# Altium schematic symbol library jlcpcb_2025_04_resistors_extended_1210.schlib: 2670 symbols (part 11 of 14) (continued)
## RK73B2ETTD432J
designator R?  Resistance: 4.3kΩ  (hidden comment: *)
Resistor, 4.3kΩ, ±5%, 500mW, ±200ppm/℃, -55℃~+155℃, SMD 1210; Manufacturer: Uniroyal; Manufacturer Part Number: RK73B2ETTD432J; Supplier 1: LCSC; Supplier Part Number 1: C830185; JLCPCB Part Number: C830185; Power Rating: 500mW; Category: Resistors; Package Size: 1210; JLCPCB Basic Part: Yes; Tolerance: ±5%; Temperature Coefficient: ±200ppm/℃; Temperature Rating: -55℃~+155℃; ComponentLink1Description: Datasheet; ComponentLink1URL: https://wmsc.lcsc.com/wmsc/upload/file/pdf/v2/lcsc/2403141437_KOA-Speer-Elec-RK73B2ETTD432J_C830185.pdf; ComponentLink2Description: JLCPCB Part URL; ComponentLink2URL: https://jlcpcb.com/partdetail/C830185
pins: 1, 2
1 alternate drawing of the same symbol

## RK73B2ETTD470J_C131366
designator R?  Resistance: 47Ω  (hidden comment: *)
Resistor, 47Ω, ±5%, 750mW, 200V, ±200ppm/℃, -55℃~+155℃, SMD 1210; Manufacturer: Uniroyal; Manufacturer Part Number: RK73B2ETTD470J; Supplier 1: LCSC; Supplier Part Number 1: C131366; JLCPCB Part Number: C131366; Power Rating: 750mW; Category: Resistors; Package Size: 1210; JLCPCB Basic Part: Yes; Tolerance: ±5%; Voltage Rating: 200V; Temperature Coefficient: ±200ppm/℃; Temperature Rating: -55℃~+155℃; ComponentLink1Description: Datasheet; ComponentLink1URL: https://wmsc.lcsc.com/wmsc/upload/file/pdf/v2/lcsc/2403141437_KOA-Speer-Elec-RK73B2ETTD470J_C131366.pdf; ComponentLink2Description: JLCPCB Part URL; ComponentLink2URL: https://jlcpcb.com/partdetail/C131366
pins: 1, 2
1 alternate drawing of the same symbol

## RK73B2ETTD470J_C520384
designator R?  Resistance: 47Ω  (hidden comment: *)
Resistor, 47Ω, ±5%, 750mW, 200V, ±200ppm/℃, -55℃~+155℃, SMD 1210; Manufacturer: Uniroyal; Manufacturer Part Number: RK73B2ETTD470J; Supplier 1: LCSC; Supplier Part Number 1: C520384; JLCPCB Part Number: C520384; Power Rating: 750mW; Category: Resistors; Package Size: 1210; JLCPCB Basic Part: Yes; Tolerance: ±5%; Voltage Rating: 200V; Temperature Coefficient: ±200ppm/℃; Temperature Rating: -55℃~+155℃; ComponentLink1Description: Datasheet; ComponentLink1URL: https://wmsc.lcsc.com/wmsc/upload/file/pdf/v2/lcsc/2403141437_KOA-Speer-Elec-RK73B2ETTD470J_C520384.pdf; ComponentLink2Description: JLCPCB Part URL; ComponentLink2URL: https://jlcpcb.com/partdetail/C520384
pins: 1, 2
1 alternate drawing of the same symbol

## RK73B2ETTD471J
designator R?  Resistance: 470Ω  (hidden comment: *)
Resistor, 470Ω, ±5%, 500mW, ±200ppm/℃, -55℃~+155℃, SMD 1210; Manufacturer: Uniroyal; Manufacturer Part Number: RK73B2ETTD471J; Supplier 1: LCSC; Supplier Part Number 1: C830186; JLCPCB Part Number: C830186; Power Rating: 500mW; Category: Resistors; Package Size: 1210; JLCPCB Basic Part: Yes; Tolerance: ±5%; Temperature Coefficient: ±200ppm/℃; Temperature Rating: -55℃~+155℃; ComponentLink1Description: Datasheet; ComponentLink1URL: https://wmsc.lcsc.com/wmsc/upload/file/pdf/v2/lcsc/2403141437_KOA-Speer-Elec-RK73B2ETTD471J_C830186.pdf; ComponentLink2Description: JLCPCB Part URL; ComponentLink2URL: https://jlcpcb.com/partdetail/C830186
pins: 1, 2
1 alternate drawing of the same symbol

## RK73B2ETTD472J
designator R?  Resistance: 4.7kΩ  (hidden comment: *)
Resistor, 4.7kΩ, ±5%, 500mW, ±200ppm/℃, -55℃~+155℃, SMD 1210; Manufacturer: Uniroyal; Manufacturer Part Number: RK73B2ETTD472J; Supplier 1: LCSC; Supplier Part Number 1: C830187; JLCPCB Part Number: C830187; Power Rating: 500mW; Category: Resistors; Package Size: 1210; JLCPCB Basic Part: Yes; Tolerance: ±5%; Temperature Coefficient: ±200ppm/℃; Temperature Rating: -55℃~+155℃; ComponentLink1Description: Datasheet; ComponentLink1URL: https://wmsc.lcsc.com/wmsc/upload/file/pdf/v2/lcsc/2403141437_KOA-Speer-Elec-RK73B2ETTD472J_C830187.pdf; ComponentLink2Description: JLCPCB Part URL; ComponentLink2URL: https://jlcpcb.com/partdetail/C830187
pins: 1, 2
1 alternate drawing of the same symbol

## RK73B2ETTD510J
designator R?  Resistance: 51Ω  (hidden comment: *)
Resistor, 51Ω, ±5%, 500mW, ±200ppm/℃, -55℃~+155℃, SMD 1210; Manufacturer: Uniroyal; Manufacturer Part Number: RK73B2ETTD510J; Supplier 1: LCSC; Supplier Part Number 1: C830190; JLCPCB Part Number: C830190; Power Rating: 500mW; Category: Resistors; Package Size: 1210; JLCPCB Basic Part: Yes; Tolerance: ±5%; Temperature Coefficient: ±200ppm/℃; Temperature Rating: -55℃~+155℃; ComponentLink1Description: Datasheet; ComponentLink1URL: https://wmsc.lcsc.com/wmsc/upload/file/pdf/v2/lcsc/2403141437_KOA-Speer-Elec-RK73B2ETTD510J_C830190.pdf; ComponentLink2Description: JLCPCB Part URL; ComponentLink2URL: https://jlcpcb.com/partdetail/C830190
pins: 1, 2
1 alternate drawing of the same symbol

## RK73B2ETTD511J
designator R?  Resistance: 510Ω  (hidden comment: *)
Resistor, 510Ω, ±5%, 500mW, 200V, ±200ppm/℃, -55℃~+155℃, SMD 1210; Manufacturer: Uniroyal; Manufacturer Part Number: RK73B2ETTD511J; Supplier 1: LCSC; Supplier Part Number 1: C516164; JLCPCB Part Number: C516164; Power Rating: 500mW; Category: Resistors; Package Size: 1210; JLCPCB Basic Part: Yes; Tolerance: ±5%; Voltage Rating: 200V; Temperature Coefficient: ±200ppm/℃; Temperature Rating: -55℃~+155℃; ComponentLink1Description: Datasheet; ComponentLink1URL: https://wmsc.lcsc.com/wmsc/upload/file/pdf/v2/lcsc/2403141437_KOA-Speer-Elec-RK73B2ETTD511J_C516164.pdf; ComponentLink2Description: JLCPCB Part URL; ComponentLink2URL: https://jlcpcb.com/partdetail/C516164
pins: 1, 2
1 alternate drawing of the same symbol

## RK73B2ETTD512J
designator R?  Resistance: 5.1kΩ  (hidden comment: *)
Resistor, 5.1kΩ, ±5%, 500mW, ±200ppm/℃, -55℃~+155℃, SMD 1210; Manufacturer: Uniroyal; Manufacturer Part Number: RK73B2ETTD512J; Supplier 1: LCSC; Supplier Part Number 1: C830191; JLCPCB Part Number: C830191; Power Rating: 500mW; Category: Resistors; Package Size: 1210; JLCPCB Basic Part: Yes; Tolerance: ±5%; Temperature Coefficient: ±200ppm/℃; Temperature Rating: -55℃~+155℃; ComponentLink1Description: Datasheet; ComponentLink1URL: https://wmsc.lcsc.com/wmsc/upload/file/pdf/v2/lcsc/2403141437_KOA-Speer-Elec-RK73B2ETTD512J_C830191.pdf; ComponentLink2Description: JLCPCB Part URL; ComponentLink2URL: https://jlcpcb.com/partdetail/C830191
pins: 1, 2
1 alternate drawing of the same symbol

## RK73B2ETTD620J
designator R?  Resistance: 62Ω  (hidden comment: *)
Resistor, 62Ω, ±5%, 500mW, ±200ppm/℃, -55℃~+155℃, SMD 1210; Manufacturer: Uniroyal; Manufacturer Part Number: RK73B2ETTD620J; Supplier 1: LCSC; Supplier Part Number 1: C830193; JLCPCB Part Number: C830193; Power Rating: 500mW; Category: Resistors; Package Size: 1210; JLCPCB Basic Part: Yes; Tolerance: ±5%; Temperature Coefficient: ±200ppm/℃; Temperature Rating: -55℃~+155℃; ComponentLink1Description: Datasheet; ComponentLink1URL: https://wmsc.lcsc.com/wmsc/upload/file/pdf/v2/lcsc/2403141437_KOA-Speer-Elec-RK73B2ETTD620J_C830193.pdf; ComponentLink2Description: JLCPCB Part URL; ComponentLink2URL: https://jlcpcb.com/partdetail/C830193
pins: 1, 2
1 alternate drawing of the same symbol

## RK73B2ETTD681J
designator R?  Resistance: 680Ω  (hidden comment: *)
Resistor, 680Ω, ±5%, 500mW, ±200ppm/℃, -55℃~+155℃, SMD 1210; Manufacturer: Uniroyal; Manufacturer Part Number: RK73B2ETTD681J; Supplier 1: LCSC; Supplier Part Number 1: C830196; JLCPCB Part Number: C830196; Power Rating: 500mW; Category: Resistors; Package Size: 1210; JLCPCB Basic Part: Yes; Tolerance: ±5%; Temperature Coefficient: ±200ppm/℃; Temperature Rating: -55℃~+155℃; ComponentLink1Description: Datasheet; ComponentLink1URL: https://wmsc.lcsc.com/wmsc/upload/file/pdf/v2/lcsc/2403141437_KOA-Speer-Elec-RK73B2ETTD681J_C830196.pdf; ComponentLink2Description: JLCPCB Part URL; ComponentLink2URL: https://jlcpcb.com/partdetail/C830196
pins: 1, 2
1 alternate drawing of the same symbol

## RK73B2ETTD753J
designator R?  Resistance: 75kΩ  (hidden comment: *)
Resistor, 75kΩ, ±5%, 500mW, ±200ppm/℃, -55℃~+155℃, SMD 1210; Manufacturer: Uniroyal; Manufacturer Part Number: RK73B2ETTD753J; Supplier 1: LCSC; Supplier Part Number 1: C830199; JLCPCB Part Number: C830199; Power Rating: 500mW; Category: Resistors; Package Size: 1210; JLCPCB Basic Part: Yes; Tolerance: ±5%; Temperature Coefficient: ±200ppm/℃; Temperature Rating: -55℃~+155℃; ComponentLink1Description: Datasheet; ComponentLink1URL: https://wmsc.lcsc.com/wmsc/upload/file/pdf/v2/lcsc/2403141437_KOA-Speer-Elec-RK73B2ETTD753J_C830199.pdf; ComponentLink2Description: JLCPCB Part URL; ComponentLink2URL: https://jlcpcb.com/partdetail/C830199
pins: 1, 2
1 alternate drawing of the same symbol

## RK73B2ETTD822J
designator R?  Resistance: 8.2kΩ  (hidden comment: *)
Resistor, 8.2kΩ, ±5%, 500mW, ±200ppm/℃, -55℃~+155℃, SMD 1210; Manufacturer: Uniroyal; Manufacturer Part Number: RK73B2ETTD822J; Supplier 1: LCSC; Supplier Part Number 1: C830200; JLCPCB Part Number: C830200; Power Rating: 500mW; Category: Resistors; Package Size: 1210; JLCPCB Basic Part: Yes; Tolerance: ±5%; Temperature Coefficient: ±200ppm/℃; Temperature Rating: -55℃~+155℃; ComponentLink1Description: Datasheet; ComponentLink1URL: https://wmsc.lcsc.com/wmsc/upload/file/pdf/v2/lcsc/2403141437_KOA-Speer-Elec-RK73B2ETTD822J_C830200.pdf; ComponentLink2Description: JLCPCB Part URL; ComponentLink2URL: https://jlcpcb.com/partdetail/C830200
pins: 1, 2
1 alternate drawing of the same symbol

## RK73B2ETTD911J
designator R?  Resistance: 910Ω  (hidden comment: *)
Resistor, 910Ω, ±5%, 500mW, ±200ppm/℃, -55℃~+155℃, SMD 1210; Manufacturer: Uniroyal; Manufacturer Part Number: RK73B2ETTD911J; Supplier 1: LCSC; Supplier Part Number 1: C830201; JLCPCB Part Number: C830201; Power Rating: 500mW; Category: Resistors; Package Size: 1210; JLCPCB Basic Part: Yes; Tolerance: ±5%; Temperature Coefficient: ±200ppm/℃; Temperature Rating: -55℃~+155℃; ComponentLink1Description: Datasheet; ComponentLink1URL: https://wmsc.lcsc.com/wmsc/upload/file/pdf/v2/lcsc/2403141437_KOA-Speer-Elec-RK73B2ETTD911J_C830201.pdf; ComponentLink2Description: JLCPCB Part URL; ComponentLink2URL: https://jlcpcb.com/partdetail/C830201
pins: 1, 2
1 alternate drawing of the same symbol

## RK73H2ETTD1R20F
designator R?  Resistance: 1.2Ω  (hidden comment: *)
Resistor, 1.2Ω, ±1%, 500mW, ±200ppm/℃, -55℃~+155℃, SMD 1210; Manufacturer: Uniroyal; Manufacturer Part Number: RK73H2ETTD1R20F; Supplier 1: LCSC; Supplier Part Number 1: C830419; JLCPCB Part Number: C830419; Power Rating: 500mW; Category: Resistors; Package Size: 1210; JLCPCB Basic Part: Yes; Tolerance: ±1%; Temperature Coefficient: ±200ppm/℃; Temperature Rating: -55℃~+155℃; ComponentLink1Description: Datasheet; ComponentLink1URL: https://wmsc.lcsc.com/wmsc/upload/file/pdf/v2/lcsc/2304140030_KOA-Speer-Elec-RK73H2ETTD1R20F_C830419.pdf; ComponentLink2Description: JLCPCB Part URL; ComponentLink2URL: https://jlcpcb.com/partdetail/C830419
pins: 1, 2
1 alternate drawing of the same symbol

## RK73H2ETTD1R50F
designator R?  Resistance: 1.5Ω  (hidden comment: *)
Resistor, 1.5Ω, ±1%, 500mW, 200V, ±200ppm/℃, -55℃~+155℃, SMD 1210; Manufacturer: Uniroyal; Manufacturer Part Number: RK73H2ETTD1R50F; Supplier 1: LCSC; Supplier Part Number 1: C516152; JLCPCB Part Number: C516152; Power Rating: 500mW; Category: Resistors; Package Size: 1210; JLCPCB Basic Part: Yes; Tolerance: ±1%; Voltage Rating: 200V; Temperature Coefficient: ±200ppm/℃; Temperature Rating: -55℃~+155℃; ComponentLink1Description: Datasheet; ComponentLink1URL: https://wmsc.lcsc.com/wmsc/upload/file/pdf/v2/lcsc/2304140030_KOA-Speer-Elec-RK73H2ETTD1R50F_C516152.pdf; ComponentLink2Description: JLCPCB Part URL; ComponentLink2URL: https://jlcpcb.com/partdetail/C516152
pins: 1, 2
1 alternate drawing of the same symbol

## RK73H2ETTD15R0F
designator R?  Resistance: 15Ω  (hidden comment: *)
Resistor, 15Ω, ±1%, 500mW, ±100ppm/℃, -55℃~+155℃, SMD 1210; Manufacturer: Uniroyal; Manufacturer Part Number: RK73H2ETTD15R0F; Supplier 1: LCSC; Supplier Part Number 1: C830418; JLCPCB Part Number: C830418; Power Rating: 500mW; Category: Resistors; Package Size: 1210; JLCPCB Basic Part: Yes; Tolerance: ±1%; Temperature Coefficient: ±100ppm/℃; Temperature Rating: -55℃~+155℃; ComponentLink1Description: Datasheet; ComponentLink1URL: https://wmsc.lcsc.com/wmsc/upload/file/pdf/v2/lcsc/2304140030_KOA-Speer-Elec-RK73H2ETTD15R0F_C830418.pdf; ComponentLink2Description: JLCPCB Part URL; ComponentLink2URL: https://jlcpcb.com/partdetail/C830418
pins: 1, 2
1 alternate drawing of the same symbol

## RK73H2ETTD27R0F
designator R?  Resistance: 27Ω  (hidden comment: *)
Resistor, 27Ω, ±1%, 500mW, 200V, ±100ppm/℃, -55℃~+155℃, SMD 1210; Manufacturer: Uniroyal; Manufacturer Part Number: RK73H2ETTD27R0F; Supplier 1: LCSC; Supplier Part Number 1: C346144; JLCPCB Part Number: C346144; Power Rating: 500mW; Category: Resistors; Package Size: 1210; JLCPCB Basic Part: Yes; Tolerance: ±1%; Voltage Rating: 200V; Temperature Coefficient: ±100ppm/℃; Temperature Rating: -55℃~+155℃; ComponentLink1Description: Datasheet; ComponentLink1URL: https://wmsc.lcsc.com/wmsc/upload/file/pdf/v2/lcsc/1912111437_KOA-Speer-Elec-RK73H2ETTD27R0F_C346144.pdf; ComponentLink2Description: JLCPCB Part URL; ComponentLink2URL: https://jlcpcb.com/partdetail/C346144
pins: 1, 2
1 alternate drawing of the same symbol

## RK73H2ETTD30R0F
designator R?  Resistance: 30Ω  (hidden comment: *)
Resistor, 30Ω, ±1%, 500mW, ±100ppm/℃, -55℃~+155℃, SMD 1210; Manufacturer: Uniroyal; Manufacturer Part Number: RK73H2ETTD30R0F; Supplier 1: LCSC; Supplier Part Number 1: C830423; JLCPCB Part Number: C830423; Power Rating: 500mW; Category: Resistors; Package Size: 1210; JLCPCB Basic Part: Yes; Tolerance: ±1%; Temperature Coefficient: ±100ppm/℃; Temperature Rating: -55℃~+155℃; ComponentLink1Description: Datasheet; ComponentLink1URL: https://wmsc.lcsc.com/wmsc/upload/file/pdf/v2/lcsc/2304140030_KOA-Speer-Elec-RK73H2ETTD30R0F_C830423.pdf; ComponentLink2Description: JLCPCB Part URL; ComponentLink2URL: https://jlcpcb.com/partdetail/C830423
pins: 1, 2
1 alternate drawing of the same symbol

## RK73H2ETTD51R1F
designator R?  Resistance: 51.1Ω  (hidden comment: *)
Resistor, 51.1Ω, ±1%, 500mW, 200V, ±100ppm/℃, -55℃~+155℃, SMD 1210; Manufacturer: Uniroyal; Manufacturer Part Number: RK73H2ETTD51R1F; Supplier 1: LCSC; Supplier Part Number 1: C284139; JLCPCB Part Number: C284139; Power Rating: 500mW; Category: Resistors; Package Size: 1210; JLCPCB Basic Part: Yes; Tolerance: ±1%; Voltage Rating: 200V; Temperature Coefficient: ±100ppm/℃; Temperature Rating: -55℃~+155℃; ComponentLink1Description: Datasheet; ComponentLink1URL: https://wmsc.lcsc.com/wmsc/upload/file/pdf/v2/lcsc/1810170743_KOA-Speer-Elec-RK73H2ETTD51R1F_C284139.pdf; ComponentLink2Description: JLCPCB Part URL; ComponentLink2URL: https://jlcpcb.com/partdetail/C284139
pins: 1, 2
1 alternate drawing of the same symbol

## RK73H2ETTD60R4F
designator R?  Resistance: 60.4Ω  (hidden comment: *)
Resistor, 60.4Ω, ±1%, 500mW, ±100ppm/℃, -55℃~+155℃, SMD 1210; Manufacturer: Uniroyal; Manufacturer Part Number: RK73H2ETTD60R4F; Supplier 1: LCSC; Supplier Part Number 1: C830424; JLCPCB Part Number: C830424; Power Rating: 500mW; Category: Resistors; Package Size: 1210; JLCPCB Basic Part: Yes; Tolerance: ±1%; Temperature Coefficient: ±100ppm/℃; Temperature Rating: -55℃~+155℃; ComponentLink1Description: Datasheet; ComponentLink1URL: https://wmsc.lcsc.com/wmsc/upload/file/pdf/v2/lcsc/2304140030_KOA-Speer-Elec-RK73H2ETTD60R4F_C830424.pdf; ComponentLink2Description: JLCPCB Part URL; ComponentLink2URL: https://jlcpcb.com/partdetail/C830424
pins: 1, 2
1 alternate drawing of the same symbol

## RK73H2ETTD61R9F
designator R?  Resistance: 61.9Ω  (hidden comment: *)
Resistor, 61.9Ω, ±1%, 500mW, ±100ppm/℃, -55℃~+155℃, SMD 1210; Manufacturer: Uniroyal; Manufacturer Part Number: RK73H2ETTD61R9F; Supplier 1: LCSC; Supplier Part Number 1: C830425; JLCPCB Part Number: C830425; Power Rating: 500mW; Category: Resistors; Package Size: 1210; JLCPCB Basic Part: Yes; Tolerance: ±1%; Temperature Coefficient: ±100ppm/℃; Temperature Rating: -55℃~+155℃; ComponentLink1Description: Datasheet; ComponentLink1URL: https://wmsc.lcsc.com/wmsc/upload/file/pdf/v2/lcsc/2304140030_KOA-Speer-Elec-RK73H2ETTD61R9F_C830425.pdf; ComponentLink2Description: JLCPCB Part URL; ComponentLink2URL: https://jlcpcb.com/partdetail/C830425
pins: 1, 2
1 alternate drawing of the same symbol

## RK73H2ETTD1001F
designator R?  Resistance: 1kΩ  (hidden comment: *)
Resistor, 1kΩ, ±1%, 500mW, 200V, ±100ppm/℃, -55℃~+155℃, SMD 1210; Manufacturer: Uniroyal; Manufacturer Part Number: RK73H2ETTD1001F; Supplier 1: LCSC; Supplier Part Number 1: C516147; JLCPCB Part Number: C516147; Power Rating: 500mW; Category: Resistors; Package Size: 1210; JLCPCB Basic Part: Yes; Tolerance: ±1%; Voltage Rating: 200V; Temperature Coefficient: ±100ppm/℃; Temperature Rating: -55℃~+155℃; ComponentLink1Description: Datasheet; ComponentLink1URL: https://wmsc.lcsc.com/wmsc/upload/file/pdf/v2/lcsc/2304140030_KOA-Speer-Elec-RK73H2ETTD1001F_C516147.pdf; ComponentLink2Description: JLCPCB Part URL; ComponentLink2URL: https://jlcpcb.com/partdetail/C516147
pins: 1, 2
1 alternate drawing of the same symbol

## RK73H2ETTD1002F
designator R?  Resistance: 10kΩ  (hidden comment: *)
Resistor, 10kΩ, ±1%, 500mW, 200V, ±100ppm/℃, -55℃~+155℃, SMD 1210; Manufacturer: Uniroyal; Manufacturer Part Number: RK73H2ETTD1002F; Supplier 1: LCSC; Supplier Part Number 1: C516148; JLCPCB Part Number: C516148; Power Rating: 500mW; Category: Resistors; Package Size: 1210; JLCPCB Basic Part: Yes; Tolerance: ±1%; Voltage Rating: 200V; Temperature Coefficient: ±100ppm/℃; Temperature Rating: -55℃~+155℃; ComponentLink1Description: Datasheet; ComponentLink1URL: https://wmsc.lcsc.com/wmsc/upload/file/pdf/v2/lcsc/2304140030_KOA-Speer-Elec-RK73H2ETTD1002F_C516148.pdf; ComponentLink2Description: JLCPCB Part URL; ComponentLink2URL: https://jlcpcb.com/partdetail/C516148
pins: 1, 2
1 alternate drawing of the same symbol

## RK73H2ETTD1200F
designator R?  Resistance: 120Ω  (hidden comment: *)
Resistor, 120Ω, ±1%, 500mW, 200V, ±100ppm/℃, -55℃~+155℃, SMD 1210; Manufacturer: Uniroyal; Manufacturer Part Number: RK73H2ETTD1200F; Supplier 1: LCSC; Supplier Part Number 1: C346143; JLCPCB Part Number: C346143; Power Rating: 500mW; Category: Resistors; Package Size: 1210; JLCPCB Basic Part: Yes; Tolerance: ±1%; Voltage Rating: 200V; Temperature Coefficient: ±100ppm/℃; Temperature Rating: -55℃~+155℃; ComponentLink1Description: Datasheet; ComponentLink1URL: https://wmsc.lcsc.com/wmsc/upload/file/pdf/v2/lcsc/2304140030_KOA-Speer-Elec-RK73H2ETTD1200F_C346143.pdf; ComponentLink2Description: JLCPCB Part URL; ComponentLink2URL: https://jlcpcb.com/partdetail/C346143
pins: 1, 2
1 alternate drawing of the same symbol

## RK73H2ETTD1301F
designator R?  Resistance: 1.3kΩ  (hidden comment: *)
Resistor, 1.3kΩ, ±1%, 500mW, ±100ppm/℃, -55℃~+155℃, SMD 1210; Manufacturer: Uniroyal; Manufacturer Part Number: RK73H2ETTD1301F; Supplier 1: LCSC; Supplier Part Number 1: C830414; JLCPCB Part Number: C830414; Power Rating: 500mW; Category: Resistors; Package Size: 1210; JLCPCB Basic Part: Yes; Tolerance: ±1%; Temperature Coefficient: ±100ppm/℃; Temperature Rating: -55℃~+155℃; ComponentLink1Description: Datasheet; ComponentLink1URL: https://wmsc.lcsc.com/wmsc/upload/file/pdf/v2/lcsc/2304140030_KOA-Speer-Elec-RK73H2ETTD1301F_C830414.pdf; ComponentLink2Description: JLCPCB Part URL; ComponentLink2URL: https://jlcpcb.com/partdetail/C830414
pins: 1, 2
1 alternate drawing of the same symbol

## RK73H2ETTD1370F
designator R?  Resistance: 137Ω  (hidden comment: *)
Resistor, 137Ω, ±1%, 500mW, ±100ppm/℃, -55℃~+155℃, SMD 1210; Manufacturer: Uniroyal; Manufacturer Part Number: RK73H2ETTD1370F; Supplier 1: LCSC; Supplier Part Number 1: C830415; JLCPCB Part Number: C830415; Power Rating: 500mW; Category: Resistors; Package Size: 1210; JLCPCB Basic Part: Yes; Tolerance: ±1%; Temperature Coefficient: ±100ppm/℃; Temperature Rating: -55℃~+155℃; ComponentLink1Description: Datasheet; ComponentLink1URL: https://wmsc.lcsc.com/wmsc/upload/file/pdf/v2/lcsc/2304140030_KOA-Speer-Elec-RK73H2ETTD1370F_C830415.pdf; ComponentLink2Description: JLCPCB Part URL; ComponentLink2URL: https://jlcpcb.com/partdetail/C830415
pins: 1, 2
1 alternate drawing of the same symbol

## RK73H2ETTD1500F
designator R?  Resistance: 150Ω  (hidden comment: *)
Resistor, 150Ω, ±1%, 500mW, ±100ppm/℃, -55℃~+155℃, SMD 1210; Manufacturer: Uniroyal; Manufacturer Part Number: RK73H2ETTD1500F; Supplier 1: LCSC; Supplier Part Number 1: C830416; JLCPCB Part Number: C830416; Power Rating: 500mW; Category: Resistors; Package Size: 1210; JLCPCB Basic Part: Yes; Tolerance: ±1%; Temperature Coefficient: ±100ppm/℃; Temperature Rating: -55℃~+155℃; ComponentLink1Description: Datasheet; ComponentLink1URL: https://wmsc.lcsc.com/wmsc/upload/file/pdf/v2/lcsc/2304140030_KOA-Speer-Elec-RK73H2ETTD1500F_C830416.pdf; ComponentLink2Description: JLCPCB Part URL; ComponentLink2URL: https://jlcpcb.com/partdetail/C830416
pins: 1, 2
1 alternate drawing of the same symbol

## RK73H2ETTD1501F
designator R?  Resistance: 1.5kΩ  (hidden comment: *)
Resistor, 1.5kΩ, ±1%, 500mW, ±100ppm/℃, -55℃~+155℃, SMD 1210; Manufacturer: Uniroyal; Manufacturer Part Number: RK73H2ETTD1501F; Supplier 1: LCSC; Supplier Part Number 1: C830417; JLCPCB Part Number: C830417; Power Rating: 500mW; Category: Resistors; Package Size: 1210; JLCPCB Basic Part: Yes; Tolerance: ±1%; Temperature Coefficient: ±100ppm/℃; Temperature Rating: -55℃~+155℃; ComponentLink1Description: Datasheet; ComponentLink1URL: https://wmsc.lcsc.com/wmsc/upload/file/pdf/v2/lcsc/2304140030_KOA-Speer-Elec-RK73H2ETTD1501F_C830417.pdf; ComponentLink2Description: JLCPCB Part URL; ComponentLink2URL: https://jlcpcb.com/partdetail/C830417
pins: 1, 2
1 alternate drawing of the same symbol

## RK73H2ETTD1801F
designator R?  Resistance: 1.8kΩ  (hidden comment: *)
Resistor, 1.8kΩ, ±1%, 500mW, ±100ppm/℃, -55℃~+155℃, SMD 1210; Manufacturer: Uniroyal; Manufacturer Part Number: RK73H2ETTD1801F; Supplier 1: LCSC; Supplier Part Number 1: C719291; JLCPCB Part Number: C719291; Power Rating: 500mW; Category: Resistors; Package Size: 1210; JLCPCB Basic Part: Yes; Tolerance: ±1%; Temperature Coefficient: ±100ppm/℃; Temperature Rating: -55℃~+155℃; ComponentLink1Description: Datasheet; ComponentLink1URL: https://wmsc.lcsc.com/wmsc/upload/file/pdf/v2/lcsc/2304140030_KOA-Speer-Elec-RK73H2ETTD1801F_C719291.pdf; ComponentLink2Description: JLCPCB Part URL; ComponentLink2URL: https://jlcpcb.com/partdetail/C719291
pins: 1, 2
1 alternate drawing of the same symbol

## RK73H2ETTD2000F
designator R?  Resistance: 200Ω  (hidden comment: *)
Resistor, 200Ω, ±1%, 500mW, ±100ppm/℃, -55℃~+155℃, SMD 1210; Manufacturer: Uniroyal; Manufacturer Part Number: RK73H2ETTD2000F; Supplier 1: LCSC; Supplier Part Number 1: C830420; JLCPCB Part Number: C830420; Power Rating: 500mW; Category: Resistors; Package Size: 1210; JLCPCB Basic Part: Yes; Tolerance: ±1%; Temperature Coefficient: ±100ppm/℃; Temperature Rating: -55℃~+155℃; ComponentLink1Description: Datasheet; ComponentLink1URL: https://wmsc.lcsc.com/wmsc/upload/file/pdf/v2/lcsc/2304140030_KOA-Speer-Elec-RK73H2ETTD2000F_C830420.pdf; ComponentLink2Description: JLCPCB Part URL; ComponentLink2URL: https://jlcpcb.com/partdetail/C830420
pins: 1, 2
1 alternate drawing of the same symbol

## RK73H2ETTD2200F
designator R?  Resistance: 220Ω  (hidden comment: *)
Resistor, 220Ω, ±1%, 500mW, 200V, ±100ppm/℃, -55℃~+155℃, SMD 1210; Manufacturer: Uniroyal; Manufacturer Part Number: RK73H2ETTD2200F; Supplier 1: LCSC; Supplier Part Number 1: C516154; JLCPCB Part Number: C516154; Power Rating: 500mW; Category: Resistors; Package Size: 1210; JLCPCB Basic Part: Yes; Tolerance: ±1%; Voltage Rating: 200V; Temperature Coefficient: ±100ppm/℃; Temperature Rating: -55℃~+155℃; ComponentLink1Description: Datasheet; ComponentLink1URL: https://wmsc.lcsc.com/wmsc/upload/file/pdf/v2/lcsc/2304140030_KOA-Speer-Elec-RK73H2ETTD2200F_C516154.pdf; ComponentLink2Description: JLCPCB Part URL; ComponentLink2URL: https://jlcpcb.com/partdetail/C516154
pins: 1, 2
1 alternate drawing of the same symbol

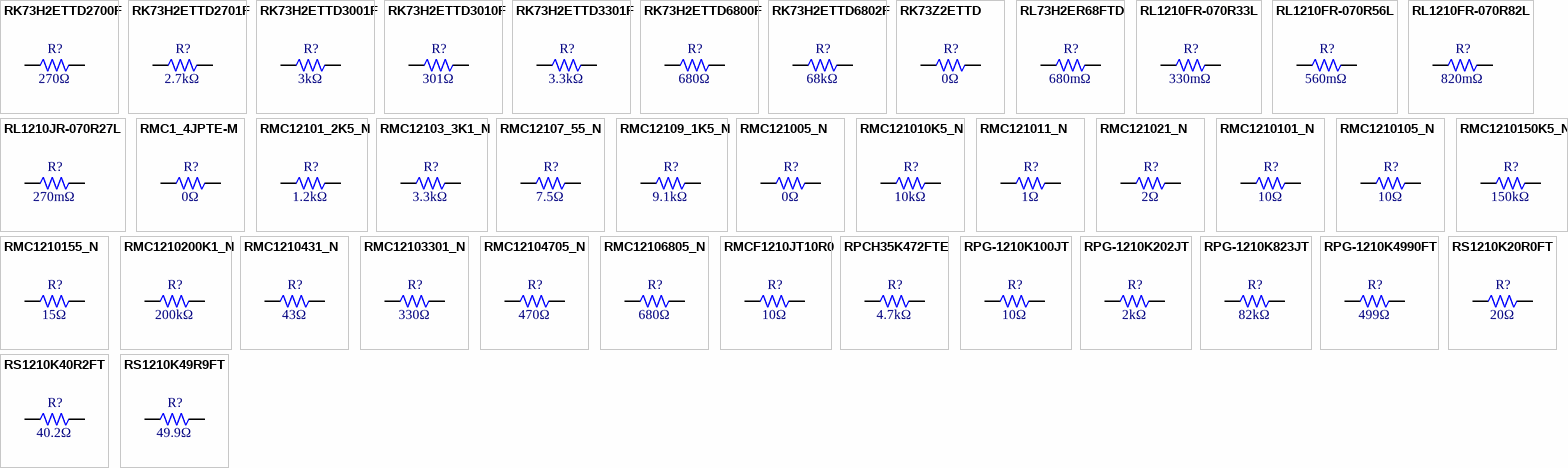
[diagram p53: symbols RK73H2ETTD2700F to RS1210K49R9FT]

## RK73H2ETTD2700F
designator R?  Resistance: 270Ω  (hidden comment: *)
Resistor, 270Ω, ±1%, 500mW, ±100ppm/℃, -55℃~+155℃, SMD 1210; Manufacturer: Uniroyal; Manufacturer Part Number: RK73H2ETTD2700F; Supplier 1: LCSC; Supplier Part Number 1: C830421; JLCPCB Part Number: C830421; Power Rating: 500mW; Category: Resistors; Package Size: 1210; JLCPCB Basic Part: Yes; Tolerance: ±1%; Temperature Coefficient: ±100ppm/℃; Temperature Rating: -55℃~+155℃; ComponentLink1Description: Datasheet; ComponentLink1URL: https://wmsc.lcsc.com/wmsc/upload/file/pdf/v2/lcsc/2304140030_KOA-Speer-Elec-RK73H2ETTD2700F_C830421.pdf; ComponentLink2Description: JLCPCB Part URL; ComponentLink2URL: https://jlcpcb.com/partdetail/C830421
pins: 1, 2
1 alternate drawing of the same symbol

## RK73H2ETTD2701F
designator R?  Resistance: 2.7kΩ  (hidden comment: *)
Resistor, 2.7kΩ, ±1%, 500mW, 200V, ±100ppm/℃, -55℃~+155℃, SMD 1210; Manufacturer: Uniroyal; Manufacturer Part Number: RK73H2ETTD2701F; Supplier 1: LCSC; Supplier Part Number 1: C516155; JLCPCB Part Number: C516155; Power Rating: 500mW; Category: Resistors; Package Size: 1210; JLCPCB Basic Part: Yes; Tolerance: ±1%; Voltage Rating: 200V; Temperature Coefficient: ±100ppm/℃; Temperature Rating: -55℃~+155℃; ComponentLink1Description: Datasheet; ComponentLink1URL: https://wmsc.lcsc.com/wmsc/upload/file/pdf/v2/lcsc/2304140030_KOA-Speer-Elec-RK73H2ETTD2701F_C516155.pdf; ComponentLink2Description: JLCPCB Part URL; ComponentLink2URL: https://jlcpcb.com/partdetail/C516155
pins: 1, 2
1 alternate drawing of the same symbol

## RK73H2ETTD3001F
designator R?  Resistance: 3kΩ  (hidden comment: *)
Resistor, 3kΩ, ±1%, 500mW, 200V, ±100ppm/℃, -55℃~+155℃, SMD 1210; Manufacturer: Uniroyal; Manufacturer Part Number: RK73H2ETTD3001F; Supplier 1: LCSC; Supplier Part Number 1: C516156; JLCPCB Part Number: C516156; Power Rating: 500mW; Category: Resistors; Package Size: 1210; JLCPCB Basic Part: Yes; Tolerance: ±1%; Voltage Rating: 200V; Temperature Coefficient: ±100ppm/℃; Temperature Rating: -55℃~+155℃; ComponentLink1Description: Datasheet; ComponentLink1URL: https://wmsc.lcsc.com/wmsc/upload/file/pdf/v2/lcsc/2304140030_KOA-Speer-Elec-RK73H2ETTD3001F_C516156.pdf; ComponentLink2Description: JLCPCB Part URL; ComponentLink2URL: https://jlcpcb.com/partdetail/C516156
pins: 1, 2
1 alternate drawing of the same symbol

## RK73H2ETTD3010F
designator R?  Resistance: 301Ω  (hidden comment: *)
Resistor, 301Ω, ±1%, 500mW, ±100ppm/℃, -55℃~+155℃, SMD 1210; Manufacturer: Uniroyal; Manufacturer Part Number: RK73H2ETTD3010F; Supplier 1: LCSC; Supplier Part Number 1: C830422; JLCPCB Part Number: C830422; Power Rating: 500mW; Category: Resistors; Package Size: 1210; JLCPCB Basic Part: Yes; Tolerance: ±1%; Temperature Coefficient: ±100ppm/℃; Temperature Rating: -55℃~+155℃; ComponentLink1Description: Datasheet; ComponentLink1URL: https://wmsc.lcsc.com/wmsc/upload/file/pdf/v2/lcsc/2304140030_KOA-Speer-Elec-RK73H2ETTD3010F_C830422.pdf; ComponentLink2Description: JLCPCB Part URL; ComponentLink2URL: https://jlcpcb.com/partdetail/C830422
pins: 1, 2
1 alternate drawing of the same symbol

## RK73H2ETTD3301F
designator R?  Resistance: 3.3kΩ  (hidden comment: *)
Resistor, 3.3kΩ, ±1%, 500mW, 200V, ±100ppm/℃, -55℃~+155℃, SMD 1210; Manufacturer: Uniroyal; Manufacturer Part Number: RK73H2ETTD3301F; Supplier 1: LCSC; Supplier Part Number 1: C516157; JLCPCB Part Number: C516157; Power Rating: 500mW; Category: Resistors; Package Size: 1210; JLCPCB Basic Part: Yes; Tolerance: ±1%; Voltage Rating: 200V; Temperature Coefficient: ±100ppm/℃; Temperature Rating: -55℃~+155℃; ComponentLink1Description: Datasheet; ComponentLink1URL: https://wmsc.lcsc.com/wmsc/upload/file/pdf/v2/lcsc/2304140030_KOA-Speer-Elec-RK73H2ETTD3301F_C516157.pdf; ComponentLink2Description: JLCPCB Part URL; ComponentLink2URL: https://jlcpcb.com/partdetail/C516157
pins: 1, 2
1 alternate drawing of the same symbol

## RK73H2ETTD6800F
designator R?  Resistance: 680Ω  (hidden comment: *)
Resistor, 680Ω, ±1%, 500mW, 200V, ±100ppm/℃, -55℃~+155℃, SMD 1210; Manufacturer: Uniroyal; Manufacturer Part Number: RK73H2ETTD6800F; Supplier 1: LCSC; Supplier Part Number 1: C516159; JLCPCB Part Number: C516159; Power Rating: 500mW; Category: Resistors; Package Size: 1210; JLCPCB Basic Part: Yes; Tolerance: ±1%; Voltage Rating: 200V; Temperature Coefficient: ±100ppm/℃; Temperature Rating: -55℃~+155℃; ComponentLink1Description: Datasheet; ComponentLink1URL: https://wmsc.lcsc.com/wmsc/upload/file/pdf/v2/lcsc/2304140030_KOA-Speer-Elec-RK73H2ETTD6800F_C516159.pdf; ComponentLink2Description: JLCPCB Part URL; ComponentLink2URL: https://jlcpcb.com/partdetail/C516159
pins: 1, 2
1 alternate drawing of the same symbol

## RK73H2ETTD6802F
designator R?  Resistance: 68kΩ  (hidden comment: *)
Resistor, 68kΩ, ±1%, 500mW, 200V, ±100ppm/℃, -55℃~+155℃, SMD 1210; Manufacturer: Uniroyal; Manufacturer Part Number: RK73H2ETTD6802F; Supplier 1: LCSC; Supplier Part Number 1: C516160; JLCPCB Part Number: C516160; Power Rating: 500mW; Category: Resistors; Package Size: 1210; JLCPCB Basic Part: Yes; Tolerance: ±1%; Voltage Rating: 200V; Temperature Coefficient: ±100ppm/℃; Temperature Rating: -55℃~+155℃; ComponentLink1Description: Datasheet; ComponentLink1URL: https://wmsc.lcsc.com/wmsc/upload/file/pdf/v2/lcsc/2304140030_KOA-Speer-Elec-RK73H2ETTD6802F_C516160.pdf; ComponentLink2Description: JLCPCB Part URL; ComponentLink2URL: https://jlcpcb.com/partdetail/C516160
pins: 1, 2
1 alternate drawing of the same symbol

## RK73Z2ETTD
designator R?  Resistance: 0Ω  (hidden comment: *)
Resistor, 0Ω, -55℃~+155℃, SMD 1210; Manufacturer: Uniroyal; Manufacturer Part Number: RK73Z2ETTD; Supplier 1: LCSC; Supplier Part Number 1: C211708; JLCPCB Part Number: C211708; Category: Resistors; Package Size: 1210; JLCPCB Basic Part: Yes; Temperature Rating: -55℃~+155℃; ComponentLink1Description: Datasheet; ComponentLink1URL: https://wmsc.lcsc.com/wmsc/upload/file/pdf/v2/lcsc/1810170642_KOA-Speer-Elec-RK73Z2ETTD_C211708.pdf; ComponentLink2Description: JLCPCB Part URL; ComponentLink2URL: https://jlcpcb.com/partdetail/C211708
pins: 1, 2
1 alternate drawing of the same symbol

## RL73H2ER68FTD
designator R?  Resistance: 680mΩ  (hidden comment: *)
Resistor, 680mΩ, ±1%, 500mW, ±100ppm/℃, -55℃~+155℃, SMD 1210; Manufacturer: Uniroyal; Manufacturer Part Number: RL73H2ER68FTD; Supplier 1: LCSC; Supplier Part Number 1: C4050380; JLCPCB Part Number: C4050380; Power Rating: 500mW; Category: Resistors; Package Size: 1210; JLCPCB Basic Part: Yes; Tolerance: ±1%; Temperature Coefficient: ±100ppm/℃; Temperature Rating: -55℃~+155℃; ComponentLink1Description: Datasheet; ComponentLink1URL: https://wmsc.lcsc.com/wmsc/upload/file/pdf/v2/lcsc/2403201241_TE-Connectivity-RL73H2ER68FTD_C4050380.pdf; ComponentLink2Description: JLCPCB Part URL; ComponentLink2URL: https://jlcpcb.com/partdetail/C4050380
pins: 1, 2
1 alternate drawing of the same symbol

## RL1210FR-070R33L
designator R?  Resistance: 330mΩ  (hidden comment: *)
Resistor, 330mΩ, ±1%, 500mW, ±600ppm/℃, -55℃~+155℃, SMD 1210; Manufacturer: Uniroyal; Manufacturer Part Number: RL1210FR-070R33L; Supplier 1: LCSC; Supplier Part Number 1: C728541; JLCPCB Part Number: C728541; Power Rating: 500mW; Category: Resistors; Package Size: 1210; JLCPCB Basic Part: Yes; Tolerance: ±1%; Temperature Coefficient: ±600ppm/℃; Temperature Rating: -55℃~+155℃; ComponentLink1Description: Datasheet; ComponentLink1URL: https://wmsc.lcsc.com/wmsc/upload/file/pdf/v2/lcsc/2305182030_YAGEO-RL1210FR-070R33L_C728541.pdf; ComponentLink2Description: JLCPCB Part URL; ComponentLink2URL: https://jlcpcb.com/partdetail/C728541
pins: 1, 2
1 alternate drawing of the same symbol

## RL1210FR-070R56L
designator R?  Resistance: 560mΩ  (hidden comment: *)
Resistor, 560mΩ, ±1%, 500mW, ±200ppm/℃, -55℃~+155℃, SMD 1210; Manufacturer: Uniroyal; Manufacturer Part Number: RL1210FR-070R56L; Supplier 1: LCSC; Supplier Part Number 1: C728547; JLCPCB Part Number: C728547; Power Rating: 500mW; Category: Resistors; Package Size: 1210; JLCPCB Basic Part: Yes; Tolerance: ±1%; Temperature Coefficient: ±200ppm/℃; Temperature Rating: -55℃~+155℃; ComponentLink1Description: Datasheet; ComponentLink1URL: https://wmsc.lcsc.com/wmsc/upload/file/pdf/v2/lcsc/2206021616_YAGEO-RL1210FR-070R56L_C728547.pdf; ComponentLink2Description: JLCPCB Part URL; ComponentLink2URL: https://jlcpcb.com/partdetail/C728547
pins: 1, 2
1 alternate drawing of the same symbol

## RL1210FR-070R82L
designator R?  Resistance: 820mΩ  (hidden comment: *)
Resistor, 820mΩ, ±1%, 500mW, ±200ppm/℃, -55℃~+155℃, SMD 1210; Manufacturer: Uniroyal; Manufacturer Part Number: RL1210FR-070R82L; Supplier 1: LCSC; Supplier Part Number 1: C728550; JLCPCB Part Number: C728550; Power Rating: 500mW; Category: Resistors; Package Size: 1210; JLCPCB Basic Part: Yes; Tolerance: ±1%; Temperature Coefficient: ±200ppm/℃; Temperature Rating: -55℃~+155℃; ComponentLink1Description: Datasheet; ComponentLink1URL: https://wmsc.lcsc.com/wmsc/upload/file/pdf/v2/lcsc/2305182030_YAGEO-RL1210FR-070R82L_C728550.pdf; ComponentLink2Description: JLCPCB Part URL; ComponentLink2URL: https://jlcpcb.com/partdetail/C728550
pins: 1, 2
1 alternate drawing of the same symbol

## RL1210JR-070R27L
designator R?  Resistance: 270mΩ  (hidden comment: *)
Resistor, 270mΩ, ±5%, 500mW, ±600ppm/℃, -55℃~+155℃, SMD 1210; Manufacturer: Uniroyal; Manufacturer Part Number: RL1210JR-070R27L; Supplier 1: LCSC; Supplier Part Number 1: C705576; JLCPCB Part Number: C705576; Power Rating: 500mW; Category: Resistors; Package Size: 1210; JLCPCB Basic Part: Yes; Tolerance: ±5%; Temperature Coefficient: ±600ppm/℃; Temperature Rating: -55℃~+155℃; ComponentLink1Description: Datasheet; ComponentLink1URL: https://wmsc.lcsc.com/wmsc/upload/file/pdf/v2/lcsc/2304140030_YAGEO-RL1210JR-070R27L_C705576.pdf; ComponentLink2Description: JLCPCB Part URL; ComponentLink2URL: https://jlcpcb.com/partdetail/C705576
pins: 1, 2
1 alternate drawing of the same symbol

## RMC1_4JPTE-M
designator R?  Resistance: 0Ω  (hidden comment: *)
Resistor, 0Ω, SMD 1210; Manufacturer: Uniroyal; Manufacturer Part Number: RMC1/4JPTE-M; Supplier 1: LCSC; Supplier Part Number 1: C340490; JLCPCB Part Number: C340490; Category: Resistors; Package Size: 1210; JLCPCB Basic Part: Yes; ComponentLink1Description: Datasheet; ComponentLink1URL: https://wmsc.lcsc.com/wmsc/upload/file/pdf/v2/lcsc/2304140030_KAMAYA-RMC1-4JPTE-M_C340490.pdf; ComponentLink2Description: JLCPCB Part URL; ComponentLink2URL: https://jlcpcb.com/partdetail/C340490
pins: 1, 2
1 alternate drawing of the same symbol

## RMC12101_2K5_N
designator R?  Resistance: 1.2kΩ  (hidden comment: *)
Resistor, 1.2kΩ, ±5%, SMD 1210; Manufacturer: Uniroyal; Manufacturer Part Number: RMC12101.2K5%N; Supplier 1: LCSC; Supplier Part Number 1: C269662; JLCPCB Part Number: C269662; Category: Resistors; Package Size: 1210; JLCPCB Basic Part: Yes; Tolerance: ±5%; ComponentLink1Description: Datasheet; ComponentLink1URL: https://wmsc.lcsc.com/wmsc/upload/file/pdf/v2/lcsc/2304140030_TyoHM-RMC12101-2K5-N_C269662.pdf; ComponentLink2Description: JLCPCB Part URL; ComponentLink2URL: https://jlcpcb.com/partdetail/C269662
pins: 1, 2
1 alternate drawing of the same symbol

## RMC12103_3K1_N
designator R?  Resistance: 3.3kΩ  (hidden comment: *)
Resistor, 3.3kΩ, ±1%, SMD 1210; Manufacturer: Uniroyal; Manufacturer Part Number: RMC12103.3K1%N; Supplier 1: LCSC; Supplier Part Number 1: C269911; JLCPCB Part Number: C269911; Category: Resistors; Package Size: 1210; JLCPCB Basic Part: Yes; Tolerance: ±1%; ComponentLink1Description: Datasheet; ComponentLink1URL: https://wmsc.lcsc.com/wmsc/upload/file/pdf/v2/lcsc/2304140030_TyoHM-RMC12103-3K1-N_C269911.pdf; ComponentLink2Description: JLCPCB Part URL; ComponentLink2URL: https://jlcpcb.com/partdetail/C269911
pins: 1, 2
1 alternate drawing of the same symbol

## RMC12107_55_N
designator R?  Resistance: 7.5Ω  (hidden comment: *)
Resistor, 7.5Ω, ±5%, SMD 1210; Manufacturer: Uniroyal; Manufacturer Part Number: RMC12107.55%N; Supplier 1: LCSC; Supplier Part Number 1: C269644; JLCPCB Part Number: C269644; Category: Resistors; Package Size: 1210; JLCPCB Basic Part: Yes; Tolerance: ±5%; ComponentLink1Description: Datasheet; ComponentLink1URL: https://wmsc.lcsc.com/wmsc/upload/file/pdf/v2/lcsc/2304140030_TyoHM-RMC12107-55-N_C269644.pdf; ComponentLink2Description: JLCPCB Part URL; ComponentLink2URL: https://jlcpcb.com/partdetail/C269644
pins: 1, 2
1 alternate drawing of the same symbol

## RMC12109_1K5_N
designator R?  Resistance: 9.1kΩ  (hidden comment: *)
Resistor, 9.1kΩ, ±5%, SMD 1210; Manufacturer: Uniroyal; Manufacturer Part Number: RMC12109.1K5%N; Supplier 1: LCSC; Supplier Part Number 1: C269671; JLCPCB Part Number: C269671; Category: Resistors; Package Size: 1210; JLCPCB Basic Part: Yes; Tolerance: ±5%; ComponentLink1Description: Datasheet; ComponentLink1URL: https://wmsc.lcsc.com/wmsc/upload/file/pdf/v2/lcsc/2304140030_TyoHM-RMC12109-1K5-N_C269671.pdf; ComponentLink2Description: JLCPCB Part URL; ComponentLink2URL: https://jlcpcb.com/partdetail/C269671
pins: 1, 2
1 alternate drawing of the same symbol

## RMC121005_N
designator R?  Resistance: 0Ω  (hidden comment: *)
Resistor, 0Ω, ±5%, SMD 1210; Manufacturer: Uniroyal; Manufacturer Part Number: RMC121005%N; Supplier 1: LCSC; Supplier Part Number 1: C325944; JLCPCB Part Number: C325944; Category: Resistors; Package Size: 1210; JLCPCB Basic Part: Yes; Tolerance: ±5%; ComponentLink1Description: Datasheet; ComponentLink1URL: https://wmsc.lcsc.com/wmsc/upload/file/pdf/v2/lcsc/2304140030_TyoHM-RMC121005-N_C325944.pdf; ComponentLink2Description: JLCPCB Part URL; ComponentLink2URL: https://jlcpcb.com/partdetail/C325944
pins: 1, 2
1 alternate drawing of the same symbol

## RMC121010K5_N
designator R?  Resistance: 10kΩ  (hidden comment: *)
Resistor, 10kΩ, ±5%, SMD 1210; Manufacturer: Uniroyal; Manufacturer Part Number: RMC121010K5%N; Supplier 1: LCSC; Supplier Part Number 1: C269639; JLCPCB Part Number: C269639; Category: Resistors; Package Size: 1210; JLCPCB Basic Part: Yes; Tolerance: ±5%; ComponentLink1Description: Datasheet; ComponentLink1URL: https://wmsc.lcsc.com/wmsc/upload/file/pdf/v2/lcsc/2304140030_TyoHM-RMC121010K5-N_C269639.pdf; ComponentLink2Description: JLCPCB Part URL; ComponentLink2URL: https://jlcpcb.com/partdetail/C269639
pins: 1, 2
1 alternate drawing of the same symbol

## RMC121011_N
designator R?  Resistance: 1Ω  (hidden comment: *)
Resistor, 1Ω, ±1%, SMD 1210; Manufacturer: Uniroyal; Manufacturer Part Number: RMC121011%N; Supplier 1: LCSC; Supplier Part Number 1: C269670; JLCPCB Part Number: C269670; Category: Resistors; Package Size: 1210; JLCPCB Basic Part: Yes; Tolerance: ±1%; ComponentLink1Description: Datasheet; ComponentLink2Description: JLCPCB Part URL; ComponentLink2URL: https://jlcpcb.com/partdetail/C269670
pins: 1, 2
1 alternate drawing of the same symbol

## RMC121021_N
designator R?  Resistance: 2Ω  (hidden comment: *)
Resistor, 2Ω, ±1%, 250mW, SMD 1210; Manufacturer: Uniroyal; Manufacturer Part Number: RMC121021%N; Supplier 1: LCSC; Supplier Part Number 1: C269669; JLCPCB Part Number: C269669; Power Rating: 250mW; Category: Resistors; Package Size: 1210; JLCPCB Basic Part: Yes; Tolerance: ±1%; ComponentLink1Description: Datasheet; ComponentLink1URL: https://wmsc.lcsc.com/wmsc/upload/file/pdf/v2/lcsc/2304140030_TyoHM-RMC121021-N_C269669.pdf; ComponentLink2Description: JLCPCB Part URL; ComponentLink2URL: https://jlcpcb.com/partdetail/C269669
pins: 1, 2
1 alternate drawing of the same symbol

## RMC1210101_N
designator R?  Resistance: 10Ω  (hidden comment: *)
Resistor, 10Ω, ±1%, SMD 1210; Manufacturer: Uniroyal; Manufacturer Part Number: RMC1210101%N; Supplier 1: LCSC; Supplier Part Number 1: C269637; JLCPCB Part Number: C269637; Category: Resistors; Package Size: 1210; JLCPCB Basic Part: Yes; Tolerance: ±1%; ComponentLink1Description: Datasheet; ComponentLink1URL: https://wmsc.lcsc.com/wmsc/upload/file/pdf/v2/lcsc/2304140030_TyoHM-RMC1210101-N_C269637.pdf; ComponentLink2Description: JLCPCB Part URL; ComponentLink2URL: https://jlcpcb.com/partdetail/C269637
pins: 1, 2
1 alternate drawing of the same symbol